# Altium integrated library main_lib.IntLib: 154 symbols (part 1 of 2) (continued)
## AS5600-ASOM (continued)
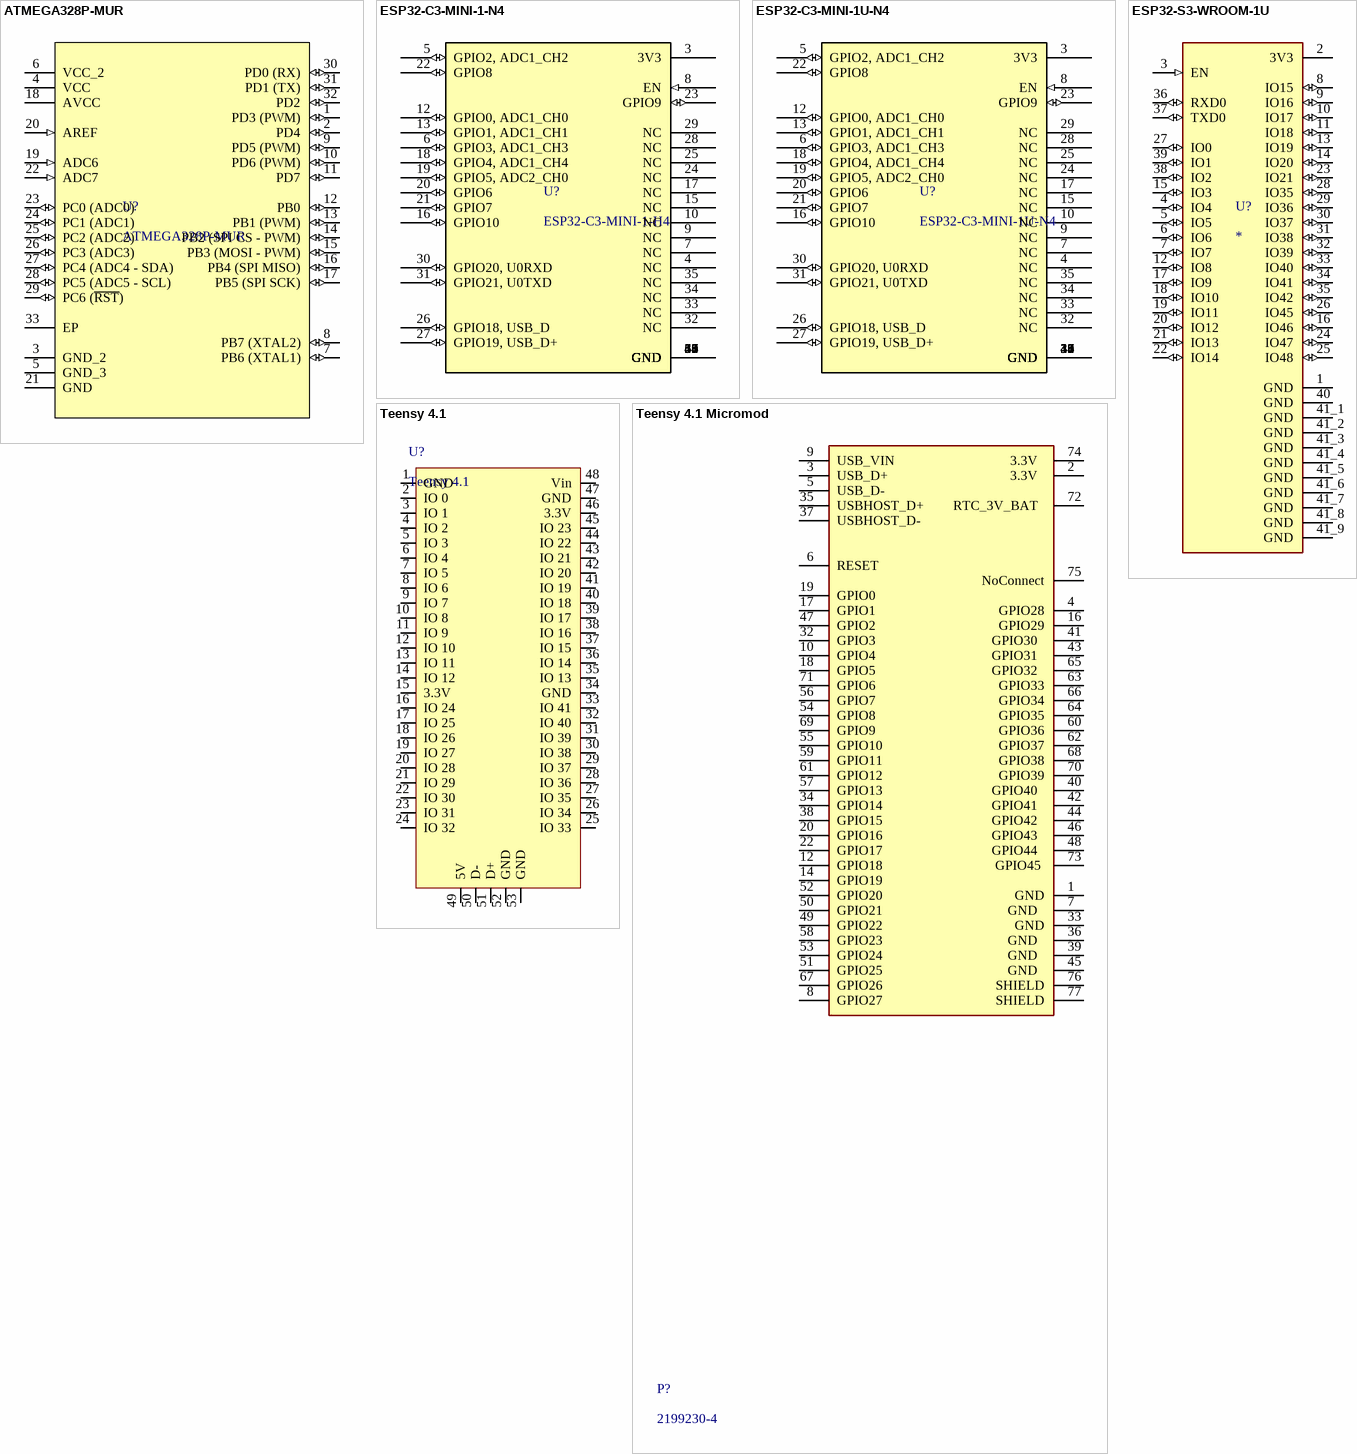
[diagram p14: symbols ATMEGA328P-MUR to Teensy 4.1 Micromod]

## ATMEGA328P-MUR
designator U?
AVR AVR® ATmega Microcontroller IC 8-Bit 20MHz 32KB (16K x 16) FLASH 32-VQFN (5x5); Supplier 1: Digikey; Supplier Part Number 1: ATMEGA328P-MURTR-ND; RefDes: RefDes; Type: Type; HelpURL: https://ww1.microchip.com/downloads/en/DeviceDoc/ATmega48A-PA-88A-PA-168A-PA-328-P-DS-DS40002061B.pdf
footprint VFQFN-32 Exposed Pad
pins: 1 PD3 (PWM) (io), 2 PD4 (io), 3 GND_2, 4 VCC (power), 5 GND_3, 6 VCC_2 (power), 7 PB6 (XTAL1) (io), 8 PB7 (XTAL2) (io), 9 PD5 (PWM) (io), 10 PD6 (PWM) (io), 11 PD7 (io), 12 PB0 (io), 13 PB1 (PWM) (io), 14 PB2 (SPI CS - PWM) (io), 15 PB3 (MOSI - PWM) (io), 16 PB4 (SPI MISO) (io), 17 PB5 (SPI SCK) (io), 18 AVCC (power), 19 ADC6 (in), 20 AREF (in), 21 GND, 22 ADC7 (in), 23 PC0 (ADC0) (io), 24 PC1 (ADC1) (io), 25 PC2 (ADC2) (io), 26 PC3 (ADC3) (io), 27 PC4 (ADC4 - SDA) (io), 28 PC5 (ADC5 - SCL) (io), 29 PC6 (~{RST}) (io), 30 PD0 (RX) (io), 31 PD1 (TX) (io), 32 PD2 (io), 33 EP

## ESP32-C3-MINI-1-N4
designator U?, comment ESP32-C3-MINI-1-H4
Bluetooth, WiFi 802.11b/g/n, Bluetooth v5.0 Transceiver Module 2.412GHz ~ 2.484GHz PCB Trace Surface Mount; Mfr_Name: Espressif Systems; Manufacturer_Part_Number: ESP32-C3-MINI-1-N4; Copyright: Copyright (C) 2023 Ultra Librarian. All rights reserved.; RefDes: RefDes; Type: Type; Datasheet: https://www.espressif.com/sites/default/files/documentation/esp32-c3-mini-1_datasheet_en.pdf
footprint ESP32-C3-MINI-1_EXP
pins: 1 GND, 2 GND, 3 3V3 (power), 4 NC, 5 GPIO2, ADC1_CH2 (io), 6 GPIO3, ADC1_CH3 (io), 7 NC, 8 EN (in), 9 NC, 10 NC, 11 GND, 12 GPIO0, ADC1_CH0 (io), 13 GPIO1, ADC1_CH1 (io), 14 GND, 15 NC, 16 GPIO10 (io), 17 NC, 18 GPIO4, ADC1_CH4 (io), 19 GPIO5, ADC2_CH0 (io), 20 GPIO6 (io), 21 GPIO7 (io), 22 GPIO8 (io), 23 GPIO9 (io), 24 NC, 25 NC, 26 GPIO18, USB_D (io), 27 GPIO19, USB_D+ (io), 28 NC, 29 NC, 30 GPIO20, U0RXD (io), 31 GPIO21, U0TXD (io), 32 NC, 33 NC, 34 NC, 35 NC, 36 GND, 37 GND, 38 GND, 39 GND, 40 GND, 41 GND, 42 GND, 43 GND, 44 GND, 45 GND, 46 GND, 47 GND, 48 GND, 49 GND, 50 GND, 51 GND, 52 GND, 53 GND, 54 GND, 55 GND, 56 GND, 57 GND, 58 GND, 59 GND, 60 GND, 61 GND

## ESP32-C3-MINI-1U-N4
designator U?
Bluetooth, WiFi 802.11b/g/n, Bluetooth v5.0 Transceiver Module 2.412GHz ~ 2.484GHz Antenna Not Included, U.FL Surface Mount; Mfr_Name: Espressif Systems; Copyright: Copyright (C) 2023 Ultra Librarian. All rights reserved.; Manufacturer_Part_Number: ESP32-C3-MINI-1U-N4; RefDes: RefDes; Type: Type; Datasheet: https://www.espressif.com/sites/default/files/documentation/esp32-c3-mini-1_datasheet_en.pdf
footprint ESP32-C3-MINI-1U-N4
pins: 1 GND, 2 GND, 3 3V3 (power), 4 NC, 5 GPIO2, ADC1_CH2 (io), 6 GPIO3, ADC1_CH3 (io), 7 NC, 8 EN (in), 9 NC, 10 NC, 11 GND, 12 GPIO0, ADC1_CH0 (io), 13 GPIO1, ADC1_CH1 (io), 14 GND, 15 NC, 16 GPIO10 (io), 17 NC, 18 GPIO4, ADC1_CH4 (io), 19 GPIO5, ADC2_CH0 (io), 20 GPIO6 (io), 21 GPIO7 (io), 22 GPIO8 (io), 23 GPIO9 (io), 24 NC, 25 NC, 26 GPIO18, USB_D (io), 27 GPIO19, USB_D+ (io), 28 NC, 29 NC, 30 GPIO20, U0RXD (io), 31 GPIO21, U0TXD (io), 32 NC, 33 NC, 34 NC, 35 NC, 36 GND, 37 GND, 38 GND, 39 GND, 40 GND, 41 GND, 42 GND, 43 GND, 44 GND, 45 GND, 46 GND, 47 GND, 48 GND, 49 GND

## ESP32-S3-WROOM-1U
designator U?
2.4 GHz Wi-Fi (802.11 b/g/n) and Bluetooth 5 (LE) module; MF: Espressif Systems; MP: ESP32-S3-WROOM-1U; Value: *; Package: Package; Check_prices: https://www.snapeda.com/parts/ESP32-S3-WROOM-1U/Espressif+Systems/view-part/?ref=eda; Price: None; SnapEDA_Link: https://www.snapeda.com/parts/ESP32-S3-WROOM-1U/Espressif+Systems/view-part/?ref=snap; Supplier 1: Digikey; Supplier Part Number 1: 1965-ESP32-S3-WROOM-1U-N8R2CT-ND
footprint XCVR_ESP32-S3-WROOM-1U
pins: 1 GND (power), 2 3V3 (power), 3 EN (in), 4 IO4 (io), 5 IO5 (io), 6 IO6 (io), 7 IO7 (io), 8 IO15 (io), 9 IO16 (io), 10 IO17 (io), 11 IO18 (io), 12 IO8 (io), 13 IO19 (io), 14 IO20 (io), 15 IO3 (io), 16 IO46 (io), 17 IO9 (io), 18 IO10 (io), 19 IO11 (io), 20 IO12 (io), 21 IO13 (io), 22 IO14 (io), 23 IO21 (io), 24 IO47 (io), 25 IO48 (io), 26 IO45 (io), 27 IO0 (io), 28 IO35 (io), 29 IO36 (io), 30 IO37 (io), 31 IO38 (io), 32 IO39 (io), 33 IO40 (io), 34 IO41 (io), 35 IO42 (io), 36 RXD0 (io), 37 TXD0 (io), 38 IO2 (io), 39 IO1 (io), 40 GND (power), 41_1 GND (power), 41_2 GND (power), 41_3 GND (power), 41_4 GND (power), 41_5 GND (power), 41_6 GND (power), 41_7 GND (power), 41_8 GND (power), 41_9 GND (power)

## Teensy 4.1
designator U?
Grade: None; Mounted: Yes; Package / Case: Header custom; Supplier 1: Digikey; Supplier Part Number 1: 1568-DEV-16771-ND
footprint Teensy_4.1
pins: 1 GND, 2 IO 0, 3 IO 1, 4 IO 2, 5 IO 3, 6 IO 4, 7 IO 5, 8 IO 6, 9 IO 7, 10 IO 8, 11 IO 9, 12 IO 10, 13 IO 11, 14 IO 12, 15 3.3V, 16 IO 24, 17 IO 25, 18 IO 26, 19 IO 27, 20 IO 28, 21 IO 29, 22 IO 30, 23 IO 31, 24 IO 32, 25 IO 33, 26 IO 34, 27 IO 35, 28 IO 36, 29 IO 37, 30 IO 38, 31 IO 39, 32 IO 40, 33 IO 41, 34 GND, 35 IO 13, 36 IO 14, 37 IO 15, 38 IO 16, 39 IO 17, 40 IO 18, 41 IO 19, 42 IO 20, 43 IO 21, 44 IO 22, 45 IO 23, 46 3.3V, 47 GND, 48 Vin, 49 5V, 50 D-, 51 D+, 52 GND, 53 GND

## Teensy 4.1 Micromod
designator P?, comment 2199230-4
CONN M.2 FMALE 67POS 0.020 GOLD / Représentant le MicroMod Teensy; Supplier 1: Digi-Key; Supplier Part Number 1: A115904TR-ND; Mounted: Yes; Package / Case: TH; Volt: N/A
footprint CONN67_2199230_TEC
pins: 1 GND, 2 3.3V  , 3 USB_D+  , 4 GPIO28, 5 USB_D-  , 6 RESET  , 7 GND  , 8 GPIO27, 9 USB_VIN  , 10 GPIO4, 12 GPIO18, 14 GPIO19, 16 GPIO29, 17 GPIO1, 18 GPIO5, 19 GPIO0, 20 GPIO16, 22 GPIO17, 32 GPIO3, 33 GND, 34 GPIO14, 35 USBHOST_D+  , 36 GND  , 37 USBHOST_D-  , 38 GPIO15, 39 GND  , 40 GPIO40  , 41 GPIO30  , 42 GPIO41  , 43 GPIO31  , 44 GPIO42  , 45 GND  , 46 GPIO43  , 47 GPIO2, 48 GPIO44  , 49 GPIO22  , 50 GPIO21, 51 GPIO25, 52 GPIO20, 53 GPIO24, 54 GPIO8  , 55 GPIO10, 56 GPIO7, 57 GPIO13, 58 GPIO23, 59 GPIO11, 60 GPIO36, 61 GPIO12, 62 GPIO37, 63 GPIO33, 64 GPIO35, 65 GPIO32  , 66 GPIO34, 67 GPIO26 , 68 GPIO38, 69 GPIO9 , 70 GPIO39, 71 GPIO6, 72 RTC_3V_BAT  , 73 GPIO45 , 74 3.3V  , 75 NoConnect, 76 SHIELD, 77 SHIELD


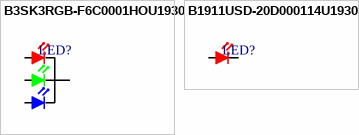
[diagram p15: symbols B3SK3RGB-F6C0001HOU1930 to B1911USD-20D000114U1930]

## B3SK3RGB-F6C0001HOU1930
designator LED?  (value not drawn)
LED RGB COMMON CATHODE (0.95(L)X; Package / Case: 4-SMD; Mounted: Yes; Supplier 1: Digi-Key; Supplier Part Number 1: 3147-B3SK3RGB-F6C0001HOU1930TR-ND
footprint LED-4-SMD-0.95
pins: 1 K, 2 R, 3 G, 4 B

## B1911USD-20D000114U1930
designator LED?  (value not drawn)
LED RED CLEAR 1608 SMD; Package / Case: 0603 (1608 Metric); Mounted: Yes; Supplier 1: Digi-Key; Supplier Part Number 1: 3147-B1911USD-20D000114U1930CT-ND
footprint LED-0603-2PIN (Metric 1608, EIA 0603. Per Yageo Product Specification V2.2)
pins: 1 K, 2 R


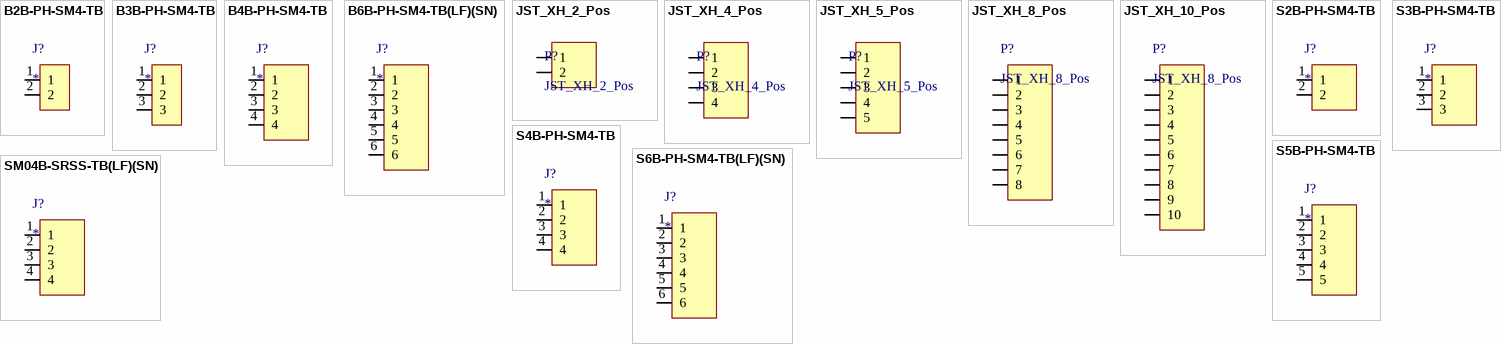
[diagram p16: symbols B2B-PH-SM4-TB to SM04B-SRSS-TB(LF)(SN)]

## B2B-PH-SM4-TB
designator J?
Connector Header Surface Mount 2 position 0.079 (2.00mm); MP: B2B-PH-SM4-TB; MF: JST; Check_prices: https://www.snapeda.com/parts/B2B-PH-SM4-TB/JST/view-part/?ref=eda; Package: NON STANDARD-2 JST; Value: *; Purchase-URL: https://pricing.snapeda.com/search/part/B2B-PH-SM4-TB/?ref=eda; SnapEDA_Link: https://www.snapeda.com/parts/B2B-PH-SM4-TB/JST/view-part/?ref=snap; Availability: In Stock; Price: None; Supplier 1: Digikey; Supplier Part Number 1: 455-B2B-PH-SM4-TBCT-ND
footprint JST_B2B-PH-SM4-TB
pins: 1, 2

## B3B-PH-SM4-TB
designator J?
Connector Header Surface Mount 3 position 0.079 _2.00mm_; MP: B3B-PH-SM4-TB; MF: JST Sales; Price: None; Value: *; Package: None; SnapEDA_Link: https://www.snapeda.com/parts/B3B-PH-SM4-TB/JST%20Sales%20America%20Inc./view-part/473683/?ref=snap; Availability: Unavailable; Supplier 1: Digikey; Supplier Part Number 1: 455-B3B-PH-SM4-TBCT-ND
footprint JST_B3B-PH-SM4-TB
pins: 1, 2, 3

## B4B-PH-SM4-TB
designator J?
Connector Header Surface Mount 4 position 0.079 (2.00mm); MP: B4B-PH-SM4-TB; MF: JST Sales; Availability: In Stock; SnapEDA_Link: https://www.snapeda.com/parts/B4B-PH-SM4-TB/JST+Sales+America+Inc./view-part/?ref=snap; Check_prices: https://www.snapeda.com/parts/B4B-PH-SM4-TB/JST+Sales+America+Inc./view-part/?ref=eda; Value: *; Price: None; Purchase-URL: https://pricing.snapeda.com/search/part/B4B-PH-SM4-TB/?ref=eda; Package: NON STANDARD-4 JST; Supplier 1: Digikey
footprint JST_B4B-PH-SM4-TB
pins: 1, 2, 3, 4

## B6B-PH-SM4-TB(LF)(SN)
designator J?
PH Series 2 mm Pitch 6 Position SMT Single Row Top Entry Shrouded Header; MP: B6B-PH-SM4-TB(LF)(SN); Price: None; Value: *; Package: None; Availability: Unavailable; Supplier 1: Digikey; Supplier Part Number 1: 455-B6B-PH-SM4-TBCT-ND
footprint JST_B6B-PH-SM4-TB(LF)(SN)
pins: 1, 2, 3, 4, 5, 6

## JST_XH_2_Pos
designator P?
CONN HEADER VERT 2POS 2.5MM; Supplier 1: Digi-Key; Supplier Part Number 1: 455-2247-ND; Mounted: Yes; Package / Case: TH; Volt: N/A
footprint JST_XH_2_Pos
pins: 1, 2

## JST_XH_4_Pos
designator P?
CONN HEADER VERT 4POS 2.5MM; Supplier 1: Digi-Key; Supplier Part Number 1: 455-2237-ND; Mounted: Yes; Package / Case: TH; Volt: N/A
footprint JST_XH_4_Pos
pins: 1, 2, 3, 4

## JST_XH_5_Pos
designator P?
CONN HEADER VERT 5POS 2.5MM; Supplier 1: Digi-Key; Supplier Part Number 1: 455-2270-ND; Mounted: Yes; Package / Case: TH; Volt: N/A
footprint JST_XH_5_Pos
pins: 1, 2, 3, 4, 5

## JST_XH_8_Pos
designator P?
CONN HEADER VERT 8POS 2.5MM; Supplier 1: Digi-Key; Supplier Part Number 1: 455-B8B-XH-A-ND; Mounted: Yes; Package / Case: TH; Volt: N/A; Help URL: https://www.jst-mfg.com/product/pdf/eng/eXH.pdf
footprint JST_XH_8_Pos
pins: 1, 2, 3, 4, 5, 6, 7, 8

## JST_XH_10_Pos
designator P?, comment JST_XH_8_Pos
CONN HEADER VERT 10POS 2.5MM; Supplier 1: Digi-Key; Supplier Part Number 1: 455-B10B-XH-A-ND; Mounted: Yes; Package / Case: TH; Volt: N/A; Help URL: https://www.jst-mfg.com/product/pdf/eng/eXH.pdf
footprint JST_XH_10_Pos
pins: 1, 2, 3, 4, 5, 6, 7, 8, 9, 10

## S2B-PH-SM4-TB
designator J?
Connector Header Surface Mount, Right Angle 2 position 0.079 (2.00mm); MP: S2B-PH-SM4-TB; MF: JST Sales; Parameter 1: 455-S2B-PH-SM4-TBCT-ND; Price: None; Availability: In Stock; Package: None; Value: *; SnapEDA_Link: https://www.snapeda.com/parts/S2B-PH-SM4-TB/JST+Sales+America+Inc./view-part/?ref=snap; Purchase-URL: https://pricing.snapeda.com/search/part/S2B-PH-SM4-TB/?ref=eda; Check_prices: https://www.snapeda.com/parts/S2B-PH-SM4-TB/JST+Sales+America+Inc./view-part/?ref=eda; Supplier 1: Digikey
footprint JST_S2B-PH-SM4-TB
pins: 1, 2

## S3B-PH-SM4-TB
designator J?
Connector Header Surface Mount, Right Angle 3 position 0.079 _2.00mm_; MF: JST Sales; MP: S3B-PH-SM4-TB; Availability: Unavailable; Price: None; Package: None; Value: *; SnapEDA_Link: https://www.snapeda.com/parts/S3B-PH-SM4-TB/JST%20Sales%20America%20Inc./view-part/473685/?ref=snap; Supplier 1: Digikey; Supplier Part Number 1: 455-S3B-PH-SM4-TBCT-ND
footprint JST_S3B-PH-SM4-TB
pins: 1, 2, 3

## S4B-PH-SM4-TB
designator J?
Connector Header Surface Mount, Right Angle 4 position 0.079 _2.00mm_; MF: JST Sales; MP: S4B-PH-SM4-TB; Package: None; Value: *; Availability: Unavailable; SnapEDA_Link: https://www.snapeda.com/parts/S4B-PH-SM4-TB/JST%20Sales%20America%20Inc./view-part/473686/?ref=snap; Price: None; Supplier 1: Digikey; Supplier Part Number 1: S4B-PH-SM4-TB
footprint JST_S4B-PH-SM4-TB
pins: 1, 2, 3, 4

## S5B-PH-SM4-TB
designator J?
Connector Header Surface Mount, Right Angle 5 position 0.079 _2.00mm_; MF: JST Sales; MP: S5B-PH-SM4-TB; Package: None; Value: *; Availability: Unavailable; SnapEDA_Link: https://www.snapeda.com/parts/S4B-PH-SM4-TB/JST%20Sales%20America%20Inc./view-part/473686/?ref=snap; Price: None; Supplier 1: Digikey; Supplier Part Number 1: 455-S5B-PH-SM4-TBCT-ND
footprint JST_S5B-PH-SM4-TB
pins: 1, 2, 3, 4, 5

## S6B-PH-SM4-TB(LF)(SN)
designator J?
Connector Header Surface Mount, Right Angle 6 position 0.079 _2.00mm_; MP: S6B-PH-SM4-TB_LF__SN_; MF: JST Sales; SnapEDA_Link: https://www.snapeda.com/parts/S6B-PH-SM4-TB_LF__SN_/JST%20Sales%20America%20Inc./view-part/491647/?ref=snap; Digi-Key_Part_Number: 455-1753-1-ND; Digi-Key_Purchase_URL: https://www.digikey.com/product-detail/en/jst-sales-america-inc/S6B-PH-SM4-TB_LF__SN_/455-1753-1-ND/926850?utm_source=snapeda&utm_medium=aggregator&utm_campaign=symbol; Value: *; Package: None; Supplier 1: Digikey; Supplier Part Number 1: 455-1753-1-ND
footprint JST_S6B-PH-SM4-TB(LF)(SN)
pins: 1, 2, 3, 4, 5, 6

## SM04B-SRSS-TB(LF)(SN)
designator J?
SH Series 1.0 mm Pitch 2 Position Single Row Side Entry Shrouded Header; MP: SM04B-SRSS-TB(LF)(SN); Price: None; Value: *; Package: None; Availability: Unavailable; Supplier 1: Digikey; Supplier Part Number 1: 455-SM04B-SRSS-TBCT-ND
footprint JST_SM04B-SRSS-TB(LF)(SN)
pins: 1, 2, 3, 4


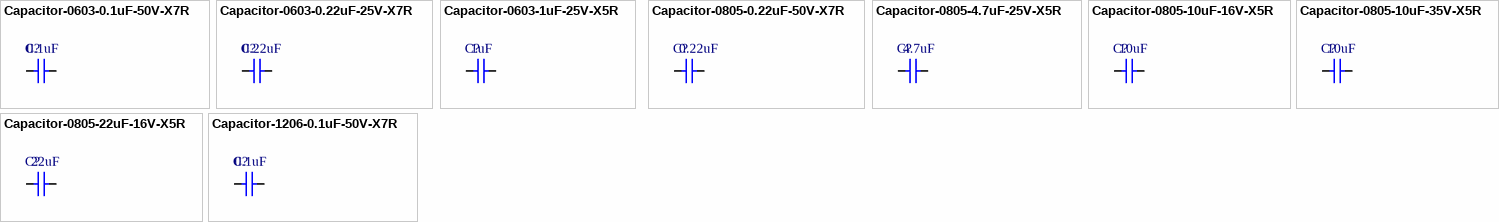
[diagram p17: symbols Capacitor-0603-0.1uF-50V-X7R to Capacitor-1206-0.1uF-50V-X7R]

## Capacitor-0603-0.1uF-50V-X7R
designator C?  value 0.1uF  (hidden comment: Capacitor-0603-0.1uF-50V-X7R)
Precision: X7R-10%; Volt: 50V; Package / Case: Metric 1608, EIA 0603; Mounted: Yes; Supplier 1: Digi-Key; Supplier Part Number 1: 1276-1935-2-ND; Supplier 2: Digi-Key; Supplier 3: Digi-Key; Supplier 4: Digi-Key; Supplier Part Number 2: 1276-1934-2-ND
footprint CAPACITOR-0603 (Metric 1608, EIA 0603)
pins: 1, 2

## Capacitor-0603-0.22uF-25V-X7R
designator C?  value 0.22uF  (hidden comment: Capacitor-0603-0.22uF-25V-X7R)
Precision: X7R-10%; Volt: 25V; Package / Case: Metric 1608, EIA 0603; Mounted: Yes; Supplier 1: Digi-Key; Supplier Part Number 1: 490-4935-2-ND; Supplier 2: Digi-Key; Supplier 3: Digi-Key; Supplier 4: Digi-Key
footprint CAPACITOR-0603 (Metric 1608, EIA 0603)
pins: 1, 2

## Capacitor-0603-1uF-25V-X5R
designator C?  value 1uF  (hidden comment: Capacitor-0603-1uF-25V-X5R)
Precision: X5R-10%; Volt: 25V; Package / Case: Metric 1608, EIA 0603; Mounted: Yes; Supplier 1: Digi-Key; Supplier Part Number 1: 1276-1859-2-ND; Supplier 2: Digi-Key; Supplier 3: Digi-Key; Supplier 4: Digi-Key; Supplier Part Number 2: 1276-1942-2-ND
footprint CAPACITOR-0603 (Metric 1608, EIA 0603)
pins: 1, 2

## Capacitor-0805-0.22uF-50V-X7R
designator C?  value 0.22uF  (hidden comment: Capacitor-0805-0.22uF-50V-X7R)
Precision: X7R-10%; Volt: 50V; Package / Case: Metric 2012 , EIA 0805; Mounted: Yes; Supplier 1: Digi-Key; Supplier Part Number 1: 399-C0805C224K5RACTUTR-ND; Supplier 2: Digi-Key; Supplier 3: Digi-Key; Supplier 4: Digi-Key
footprint CAPACITOR-0805 (Metric 2012, EIA 0805, Per Yageo Product Specification V2.2)
pins: 1, 2

## Capacitor-0805-4.7uF-25V-X5R
designator C?  value 4.7uF  (hidden comment: Capacitor-0805-4.7uF-25V-X5R)
Precision: X5R-10%; Volt: 25V; Package / Case: Metric 2012 , EIA 0805; Mounted: Yes; Supplier 1: Digi-Key; Supplier Part Number 1: 1276-1244-2-ND; Supplier 2: Digi-Key; Supplier 3: Digi-Key; Supplier 4: Digi-Key
footprint CAPACITOR-0805 (Metric 2012, EIA 0805, Per Yageo Product Specification V2.2)
pins: 1, 2

## Capacitor-0805-10uF-16V-X5R
designator C?  value 10uF  (hidden comment: Capacitor-0805-10uF-16V-X5R)
Precision: X5R-10%; Volt: 16V; Package / Case: Metric 2012 , EIA 0805; Mounted: Yes; Supplier 1: Digi-Key; Supplier Part Number 1: 1276-1096-2-ND; Supplier 2: Digi-Key; Supplier 3: Digi-Key; Supplier 4: Digi-Key
footprint CAPACITOR-0805 (Metric 2012, EIA 0805, Per Yageo Product Specification V2.2)
pins: 1, 2

## Capacitor-0805-10uF-35V-X5R
designator C?  value 10uF  (hidden comment: Capacitor-0805-10uF-35V-X5R)
Precision: X5R-10%; Volt: 35V; Package / Case: Metric 2012 , EIA 0805; Mounted: Yes; Supplier 1: Digi-Key; Supplier Part Number 1: 490-10515-1-ND; Supplier 2: Digi-Key; Supplier 3: Digi-Key; Supplier 4: Digi-Key
footprint CAPACITOR-0805 (Metric 2012, EIA 0805, Per Yageo Product Specification V2.2)
pins: 1, 2

## Capacitor-0805-22uF-16V-X5R
designator C?  value 22uF  (hidden comment: Capacitor-0805-22uF-16V-X5R)
Precision: X5R-10%; Volt: 16V; Package / Case: Metric 2012 , EIA 0805; Mounted: Yes; Supplier 1: Digi-Key; Supplier Part Number 1: 1276-6780-1-ND; Supplier 2: Digi-Key; Supplier 3: Digi-Key; Supplier 4: Digi-Key
footprint CAPACITOR-0805 (Metric 2012, EIA 0805, Per Yageo Product Specification V2.2)
pins: 1, 2

## Capacitor-1206-0.1uF-50V-X7R
designator C?  value 0.1uF  (hidden comment: Capacitor-1206-0.1uF-50V-X7R)
Precision: X7R-10%; Volt: 50V; Package / Case: Metric 3216, EIA 1206; Mounted: Yes; Supplier 1: Digi-Key; Supplier Part Number 1: 399-C1206C104K5RAC7800TR-ND; Supplier 2: Digi-Key; Supplier 3: Digi-Key; Supplier 4: Digi-Key; Supplier Part Number 2: 399-C1206C104M5RAC7800TR-ND
footprint CAPACITOR-1206 (Metric 3216, EIA 1206, Per Yageo Product Specification V2.2)
pins: 1, 2


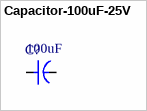
[diagram p18: symbol Capacitor-100uF-25V]

## Capacitor-100uF-25V
designator C?, comment value 100uF  (hidden comment: CAP ALUM 100UF 20% 25V RADIAL)
Volt: 25V; Precision: 20%; Mounted: Yes; Supplier 1: Digi-Key; Supplier Part Number 1: 399-6102-ND; Supplier 2: Digi-Key; Supplier 3: Digi-Key; Supplier 4: Digi-Key
footprint CAPACITOR-Aluminium-5x11mm-2mmPitch (5mm dia x 11mm height Capacitor)
pins: 1, 2


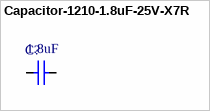
[diagram p19: symbol Capacitor-1210-1.8uF-25V-X7R]

## Capacitor-1210-1.8uF-25V-X7R
designator C?  value 1.8uF  (hidden comment: Capacitor-1210-1.8uF-25V-X7R)
Volt: 16V; Precision: X7R-10%; Package / Case: Metric 3225, EIA 1210; Mounted: Yes; Supplier 1: Digi-Key; Supplier Part Number 1: 399-3082-1-ND; Supplier 2: Digi-Key; Supplier 3: Digi-Key; Supplier 4: Digi-Key
footprint CAPACITOR-1210 (Metric 3225, EIA 1210. Per Yageo Product Specification V2.2)
pins: 1, 2


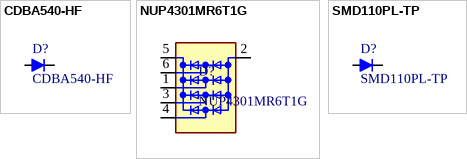
[diagram p20: symbols CDBA540-HF to SMD110PL-TP]

## CDBA540-HF
designator D?
DIODE SCHOTTKY 40V 5A SMA; Supplier 1: Digi-Key; Supplier Part Number 1: 641-1707-1-ND; Mounted: Yes; Package / Case: SMA; Volt: 40V
footprint SMA/DO-214AC (SMA, DO-214AC. From Diode DS19005 rev 16-2)
pins: 1 A, 2 K

## NUP4301MR6T1G
designator D?
4CH Clamp Ipp Tvs Diode Surface Mount SOT23-6 (SC74); Volt: 70; Supplier 1: Digi-Key; Supplier Part Number 1: NUP4301MR6T1GOSTR-ND; Mounted: Yes; Package / Case: SOT23-6
footprint SOT-23-6 (SOT23-6, from TI DDC (R-PDSO-G6))
pins: 1 L2, 2 GND, 3 L3, 4 L4, 5 VDD, 6 L1

## SMD110PL-TP
designator D?
DIODE SCHOTTKY 100V 1A SOD123FL; Supplier 1: Digi-Key; Supplier Part Number 1: SMD110PL-TPMSTR-ND; Mounted: Yes; Package / Case: SOD123FL; Volt: 100V
footprint SOD-123F (SOD-123F from https://www.diodes.com/assets/Package-Files/SOD123F.pdf on 2017-03-16)
pins: 1 A, 2 K


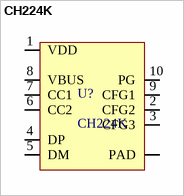
[diagram p21: symbol CH224K]

## CH224K
designator U?
IC USB-PD Controller / ESSOP-10; Grade: None; Supplier 1: LCSC; Supplier Part Number 1: C970725; Package / Case: ESSOP-10; Mounted: Yes
footprint SOP10-PAD
pins: 1 VDD, 2 CFG2, 3 CFG3, 4 DP, 5 DM, 6 CC2, 7 CC1, 8 VBUS, 9 CFG1, 10 PG, PAD


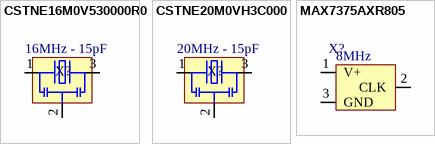
[diagram p22: symbols CSTNE16M0V530000R0 to MAX7375AXR805]

## CSTNE16M0V530000R0
designator X?  value 16MHz - 15pF  (hidden comment: CSTNE16M0V530000R0)
CERAMIC RES 16.0000MHZ 15PF SMD; Precision: ±0.20%; Mounted: Yes; Supplier 1: Digi-Key; Supplier Part Number 1: 490-17948-2-ND; Package / Case: 3-SMD 3.20mm x 1.30mm
footprint Resonator-CSTNE (Murata CSTNE series resonator. Built from CSTNE20M0VH3C000R0 datasheet)
pins: 1, 2, 3

## CSTNE20M0VH3C000
designator X?  value 20MHz - 15pF  (hidden comment: CSTNE20M0VH3C000)
CERAMIC RES 20.0000MHZ 15PF SMD; Precision: ±0.20%; Mounted: Yes; Supplier 1: Digi-Key; Supplier Part Number 1: 490-17956-1-ND; Package / Case: 3-SMD 3.20mm x 1.30mm
footprint Resonator-CSTNE (Murata CSTNE series resonator. Built from CSTNE20M0VH3C000R0 datasheet)
pins: 1, 2, 3

## MAX7375AXR805
designator X?  value 8MHz  (hidden comment: MAX7375AXR805)
MEMS OSC XO 8.0000MHZ CMOS SMD; Mounted: Yes; Supplier 1: Digi-Key; Supplier Part Number 1: MAX7375AXR805+TCT-ND; Package / Case: SOT-23; helpURL: https://www.analog.com/media/en/technical-documentation/data-sheets/max7375.pdf
footprint SOT-23-3 (SOT23-3, from TI DBZ (R-PDSO-G3))
pins: 1 V+, 2 CLK, 3 GND
